# Altium footprint library std-th.PcbLib: 245 footprints (part 8 of 16)
Each footprint in its own frame and in the unit in brackets; x right, y up, seen from the top. Pads: shape width x height; smd on the part's side, far side on the other; paste and mask are expansions set on the pad; w line width, h text height; cw(c..) or ccw(c..) is an arc to the next point about the centre after c.
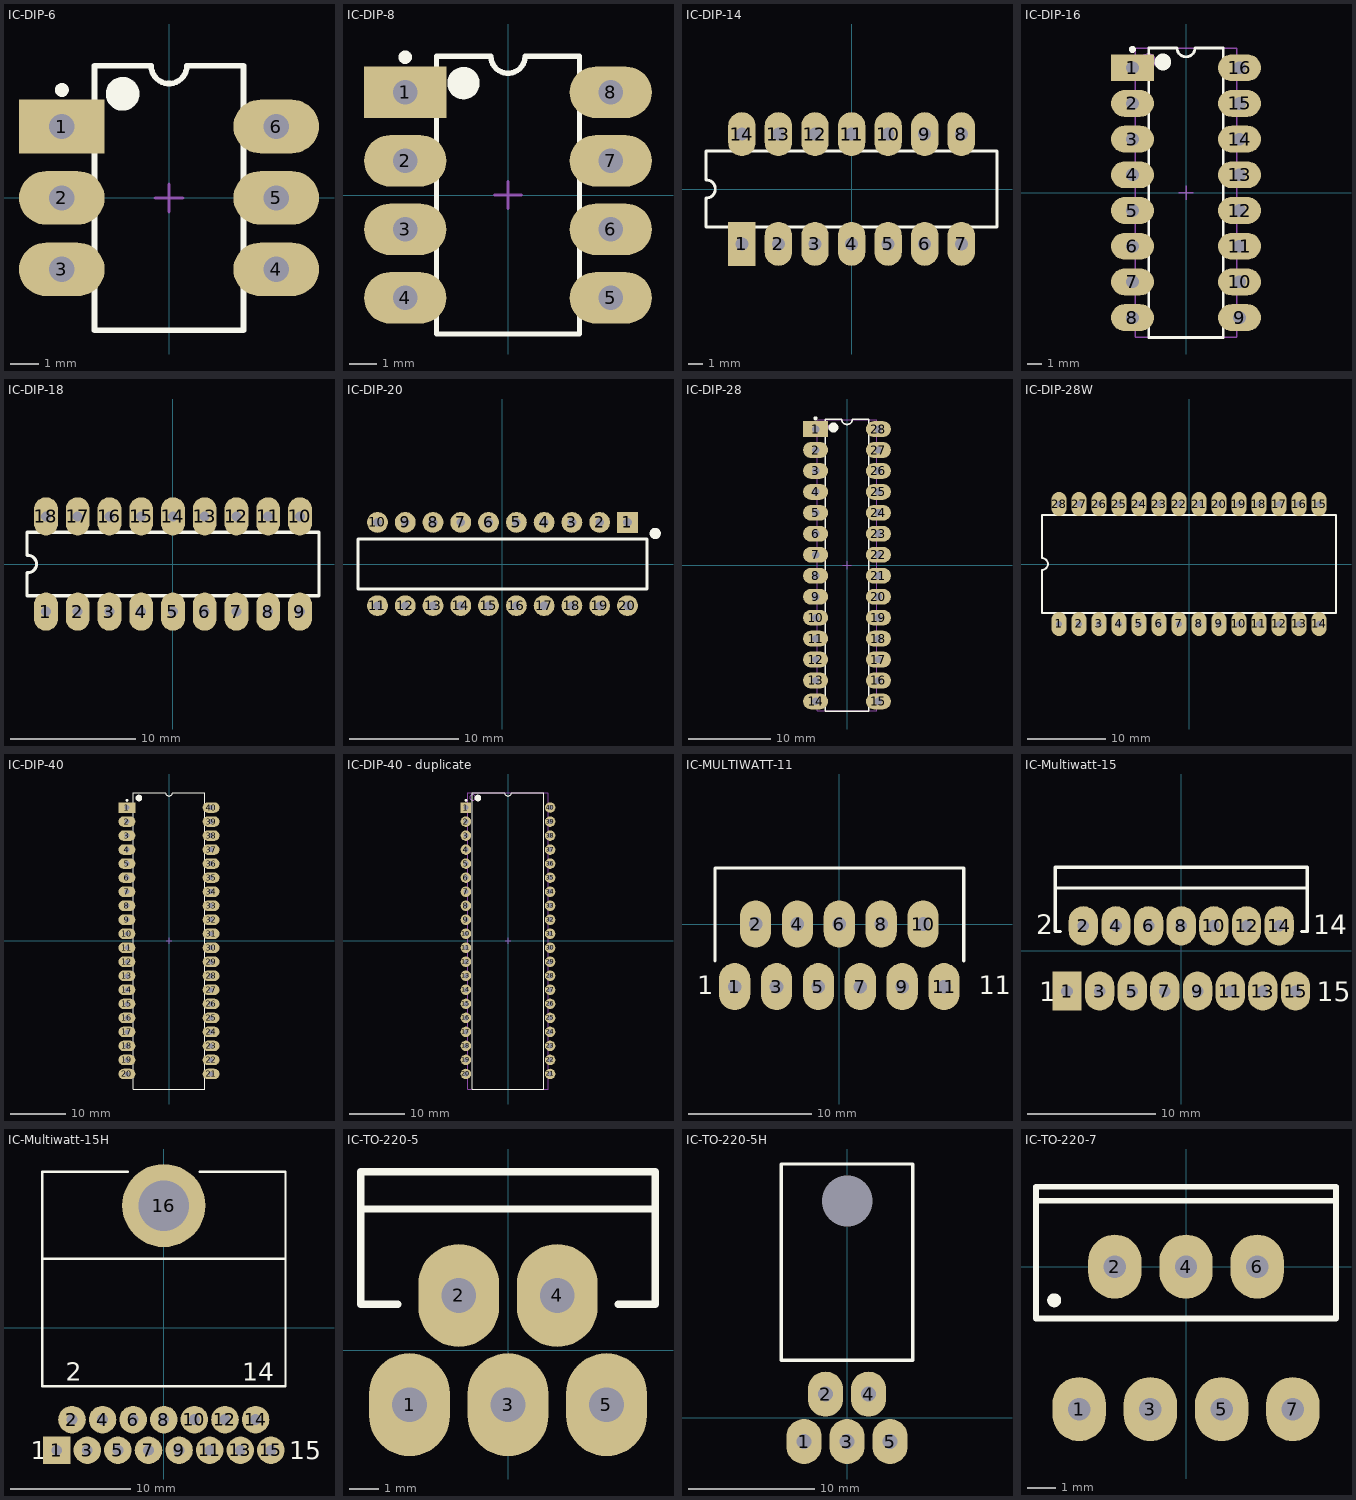
[diagram p7: the footprints below, top view; thin cyan lines are the x and y axes]

## IC-DIP-6 [mil] "DIP; 6 Leads; Row Spacing 7.62 mm; Pitch 2.54 mm"
height 214.96
pads (6):
  rect 120x75 hole 35.43: 1(-150,100)
  oval 120x75 hole 35.43: 2(-150,0) 3(-150,-100) 4(150,-100) 5(150,0) 6(150,100)
Top Overlay:
  circle w9.84: c-150,151.18 r4.92
  circle w23.62: c-64.96,145.67 r11.81
  lines w7.87: -104.33,-185.04 -104.33,185.04 -25,185.04 ccw(c0,185.04) 25,185.04 104.33,185.04 104.33,-185.04 -104.33,-185.04
Mechanical 15:
  lines w3.94: -19.68,0 19.68,0 ; 0,-19.68 0,19.68
3D body: height 224.8, standoff -125.2, extent -155.9,-175 155.91,175

## IC-DIP-8 [mil] "DIP, 8-Leads, Row Spacing 7.62mm, Pitch 2.54mm, Body 9.78x6.48mm"
height 175.2
pads (8):
  rect 120x75 hole 35.43: 1(-150,150)
  oval 120x75 hole 35.43: 2(-150,50) 3(-150,-50) 4(-150,-150) 5(150,-150) 6(150,-50) 7(150,50) 8(150,150)
Top Overlay:
  circle w23.62: c-64.96,163.39 r11.81
  circle w9.84: c-150,201.18 r4.92
  lines w7.87: -104.33,-202.76 104.33,-202.76 104.33,202.76 25,202.76 cw(c0,202.76) -25,202.76 -104.33,202.76 -104.33,-202.76
Mechanical 15:
  lines w3.94: -19.68,0 19.68,0 ; 0,-19.68 0,19.68
3D body: height 179.92, standoff -150, extent -153.93,-195.07 153.94,195.08

## IC-DIP-14 [mil] "DIP; 14 Leads; Row Spacing 7.62 mm; Pitch 2.54 mm"
height 200
pads (14):
  rect 75x120 hole 35.43: 1(-300,-150)
  oval 75x120 hole 35.43: 2(-200,-150) 3(-100,-150) 4(0,-150) 5(100,-150) 6(200,-150) 7(300,-150) 8(300,150) 9(200,150) 10(100,150) 11(0,150) 12(-100,150) 13(-200,150) 14(-300,150)
Top Overlay:
  lines w7.87: -397.64,-104.33 -397.64,-25 ccw(c-397.64,0) -397.64,25 -397.64,104.33 397.64,104.33 397.64,-104.33 -397.64,-104.33
3D body: height 177.17, standoff -137.8, extent -356.29,-152.76 356.3,152.77

## IC-DIP-16 [mil] "DIP; 16 Leads; Row Spacing 7.62 mm; Pitch 2.54 mm"
height 200
pads (16):
  rect 120x75 hole 35.43: 1(-150,350)
  oval 120x75 hole 35.43: 2(-150,250) 3(-150,150) 4(-150,50) 5(-150,-50) 6(-150,-150) 7(-150,-250) 8(-150,-350) 9(150,-350) 10(150,-250) 11(150,-150) 12(150,-50) 13(150,50) 14(150,150) 15(150,250) 16(150,350)
Top Overlay:
  circle w9.84: c-150,401.18 r4.92
  circle w23.62: c-64.96,366.14 r11.81
  lines w7.87: -104.33,-405.51 -104.33,405.51 -25,405.51 ccw(c0,405.51) 25,405.51 104.33,405.51 104.33,-405.51 -104.33,-405.51
Mechanical 13:
  circle w3.94: c-106.3,369.09 r19.68
  lines w3.94: -141.73,-404.53 -141.73,404.53 141.73,404.53 141.73,-404.53 -141.73,-404.53
Mechanical 15:
  lines w3.94: -19.68,0 19.68,0 ; 0,-19.68 0,19.68
3D body: height 202.76, standoff -98.03, extent -154.92,-433.08 154.92,433.06

## IC-DIP-18 [mil] "DIP-18 package, 100 mil pitch, 300 mil row pitch"
height 314.96
pads (18):
  oval 75x120 hole 31.5: 1(-400,-150) 2(-300,-150) 3(-200,-150) 4(-100,-150) 5(0,-150) 6(100,-150) 7(200,-150) 8(300,-150) 9(400,-150) 10(400,150) 11(300,150) 12(200,150) 13(100,150) 14(0,150) 15(-100,150) 16(-200,150) 17(-300,150) 18(-400,150)
Top Overlay:
  lines w10: -460.24,-99.76 -460.24,-27.38 ccw(c-457.49,-0.01) -460.24,27.37 -460.24,99.76 459.76,99.76 460,100 460,-99.76 350,-99.76 -460.24,-99.76
3D body: height 179.92, standoff -150, extent -457.49,-153.94 457.48,153.93

## IC-DIP-20 [mm] "IC, DIP 20"
height 3.5
pads (20):
  rect 1.905x1.905 hole 0.8: 1(11.43,3.81)
  round 1.905 hole 0.8: 2(8.89,3.81) 3(6.35,3.81) 4(3.81,3.81) 5(1.27,3.81) 6(-1.27,3.81) 7(-3.81,3.81) 8(-6.35,3.81) 9(-8.89,3.81) 10(-11.43,3.81) 11(-11.43,-3.81) 12(-8.89,-3.81) 13(-6.35,-3.81) 14(-3.81,-3.81) 15(-1.27,-3.81) 16(1.27,-3.81) 17(3.81,-3.81) 18(6.35,-3.81) 19(8.89,-3.81) 20(11.43,-3.81)
Top Overlay:
  circle w0.508: c13.97,2.794 r0.254
  lines w0.254: -13.208,-2.286 -13.208,2.286 13.208,2.286 13.208,-2.286 12.954,-2.286 -13.208,-2.286
3D body: height 4.57, standoff -3.81, extent -13.27,-3.916 13.27,3.904

## IC-DIP-28 [mil] "DIP, 28-Leads, Row Spacing 7.62mm, Pitch 2.54mm, Body 34.67x7.3mm"
height 180.31
pads (28):
  rect 120x75 hole 35.43: 1(-150,650)
  oval 120x75 hole 35.43: 2(-150,550) 3(-150,450) 4(-150,350) 5(-150,250) 6(-150,150) 7(-150,50) 8(-150,-50) 9(-150,-150) 10(-150,-250) 11(-150,-350) 12(-150,-450) 13(-150,-550) 14(-150,-650) 15(150,-650) 16(150,-550) 17(150,-450) 18(150,-350) 19(150,-250) 20(150,-150) 21(150,-50) 22(150,50) 23(150,150) 24(150,250) 25(150,350) 26(150,450) 27(150,550) 28(150,650)
Top Overlay:
  circle w23.62: c-64.96,657.48 r11.81
  circle w9.84: c-150,701.18 r4.92
  lines w7.87: -104.33,-696.85 104.33,-696.85 104.33,696.85 25,696.85 cw(c0,696.85) -25,696.85 -104.33,696.85 -104.33,-696.85
Mechanical 13:
  circle w3.94: c-106.3,659.45 r19.68
  lines w3.94: -141.73,-694.88 141.73,-694.88 141.73,694.88 -141.73,694.88 -141.73,-694.88
Mechanical 15:
  lines w3.94: -19.68,0 19.68,0 ; 0,-19.68 0,19.68
3D body: height 179.92, standoff -150, extent -153.94,-689.96 153.93,689.97

## IC-DIP-28W [mil] "DIP-28, wide"
height 314.96
pads (28):
  oval 75x120 hole 31.5: 1(-650,-300) 2(-550,-300) 3(-450,-300) 4(-350,-300) 5(-250,-300) 6(-150,-300) 7(-50,-300) 8(50,-300) 9(150,-300) 10(250,-300) 11(350,-300) 12(450,-300) 13(550,-300) 14(650,-300) 15(650,300) 16(550,300) 17(450,300) 18(350,300) 19(250,300) 20(150,300) 21(50,300) 22(-50,300) 23(-150,300) 24(-250,300) 25(-350,300) 26(-450,300) 27(-550,300) 28(-650,300)
Top Overlay:
  lines w10: -735.01,-244.99 -735.01,-29.96 ccw(c-735.05,-0.01) -734.99,29.95 -735,245 735,245 735,-245 -735,-245
3D body: height 200.39, standoff -150, extent -735.05,-303.94 735.03,303.93

## IC-DIP-40 [mil] "DIP, 40-Leads, Row Spacing 600 mil, 100 mil pitch"
height 250
pads (40):
  rect 120x75 hole 35.43: 1(-300,950)
  oval 120x75 hole 35.43: 2(-300,850) 3(-300,750) 4(-300,650) 5(-300,550) 6(-300,450) 7(-300,350) 8(-300,250) 9(-300,150) 10(-300,50) 11(-300,-50) 12(-300,-150) 13(-300,-250) 14(-300,-350) 15(-300,-450) 16(-300,-550) 17(-300,-650) 18(-300,-750) 19(-300,-850) 20(-300,-950) 21(300,-950) 22(300,-850) 23(300,-750) 24(300,-650) 25(300,-550) 26(300,-450) 27(300,-350) 28(300,-250) 29(300,-150) 30(300,-50) 31(300,50) 32(300,150) 33(300,250) 34(300,350) 35(300,450) 36(300,550) 37(300,650) 38(300,750) 39(300,850) 40(300,950)
Top Overlay:
  circle w23.62: c-214.57,1017.72 r11.81
  circle w9.84: c-300,1001.18 r4.92
  lines w7.87: -253.94,-1057.09 253.94,-1057.09 253.94,1057.09 25,1057.09 cw(c0,1057.09) -25,1057.09 -253.94,1057.09 -253.94,-1057.09
Mechanical 15:
  lines w3.94: -19.68,0 19.68,0 ; 0,-19.68 0,19.68
3D body: height 224.41, standoff -101.57, extent -304.92,-1032.48 304.92,1032.48

## IC-DIP-40 - duplicate [mm] "DIP, 40-Leads, Row Spacing 15.24mm, Pitch 2.54mm, Body 51.8x13.5mm"
height 6.35
pads (40):
  rect 1.905x1.905 hole 0.9: 1(-7.62,24.13)
  round 1.905 hole 0.9: 2(-7.62,21.59) 3(-7.62,19.05) 4(-7.62,16.51) 5(-7.62,13.97) 6(-7.62,11.43) 7(-7.62,8.89) 8(-7.62,6.35) 9(-7.62,3.81) 10(-7.62,1.27) 11(-7.62,-1.27) 12(-7.62,-3.81) 13(-7.62,-6.35) 14(-7.62,-8.89) 15(-7.62,-11.43) 16(-7.62,-13.97) 17(-7.62,-16.51) 18(-7.62,-19.05) 19(-7.62,-21.59) 20(-7.62,-24.13) 21(7.62,-24.13) 22(7.62,-21.59) 23(7.62,-19.05) 24(7.62,-16.51) 25(7.62,-13.97) 26(7.62,-11.43) 27(7.62,-8.89) 28(7.62,-6.35) 29(7.62,-3.81) 30(7.62,-1.27) 31(7.62,1.27) 32(7.62,3.81) 33(7.62,6.35) 34(7.62,8.89) 35(7.62,11.43) 36(7.62,13.97) 37(7.62,16.51) 38(7.62,19.05) 39(7.62,21.59) 40(7.62,24.13)
Top Overlay:
  circle w0.6: c-5.45,25.85 r0.3
  circle w0.25: c-7.62,25.43 r0.125
  lines w0.2: -6.45,-26.85 6.45,-26.85 6.45,26.85 0.635,26.85 cw(c0,26.85) -0.635,26.85 -6.45,26.85 -6.45,-26.85
Mechanical 13:
  circle w0.1: c-6.4,25.95 r0.5
  lines w0.1: -7.3,-26.85 7.3,-26.85 7.3,26.85 -7.3,26.85 -7.3,-26.85
Mechanical 15:
  lines w0.1: -0.5,0 0.5,0 ; 0,-0.5 0,0.5
3D body: height 4.06, standoff -3.3, extent -7.765,-26.13 7.765,26.13

## IC-MULTIWATT-11 [mm] "IC, Multiwatt 11"
height 20
pads (11):
  oval 2.54x3.81 hole 1.1: 1(-8.5,-5.08) 2(-6.8,0) 3(-5.1,-5.08) 4(-3.4,0) 5(-1.7,-5.08) 6(0,0) 7(1.7,-5.08) 8(3.4,0) 9(5.1,-5.08) 10(6.8,0) 11(8.5,-5.08)
Top Overlay:
  lines w0.254: -10.1,-2.988 -10.1,4.55 10.1,4.55 10.1,-2.988
  text "11" at 11.303,-5.715 h1.5
  text "1" at -11.557,-5.715 h1.5
3D body: height 21.8, standoff -3.2, extent -10.1,-5.34 10.1,4.55

## IC-Multiwatt-15 [mil] "TO, Thru-Hole, Horizontal, 15 Leads; Pitch 1.27 mm"
height 1181.1
pads (15):
  rect 90x120 hole 35.43: 1(-350,-124.14)
  oval 90x120 hole 35.43: 2(-300,75.86) 3(-250,-124.14) 4(-200,75.86) 5(-150,-124.14) 6(-100,75.86) 7(-50,-124.14) 8(0,75.86) 9(50,-124.14) 10(100,75.86) 11(150,-124.14) 12(200,75.86) 13(250,-124.14) 14(300,75.86) 15(350,-124.14)
Top Overlay:
  lines w10: -385.83,192 385.82,192 ; -370,58.14 -385.83,58.14 -385.83,255 385.82,255 385.83,255 385.83,58.15 385.82,58.14 368.14,58.14
  text "2" at -445,50 h59.06
  text "14" at 405,50 h59.06
  text "1" at -435,-155 h59.06
  text "15" at 415,-155 h59.06
3D body: height 833.12, standoff -44.83, extent -385.83,-134.37 385.83,255

## IC-Multiwatt-15H [mm] "TO, Thru-Hole, Horizontal, Heatsink Mounted; 15 Bent Staggered Leads; Pitch 1.27 mm"
height 5
pads (16):
  rect 2.286x2.286 hole 0.9: 1(-8.89,-10.155)
  round 2.286 hole 0.9: 2(-7.62,-7.615) 3(-6.35,-10.155) 4(-5.08,-7.615) 5(-3.81,-10.155) 6(-2.54,-7.615) 7(-1.27,-10.155) 8(0,-7.615) 9(1.27,-10.155) 10(2.54,-7.615) 11(3.81,-10.155) 12(5.08,-7.615) 13(6.35,-10.155) 14(7.62,-7.615) 15(8.89,-10.155)
  round 6.9 hole 4.2: 16(0,10.155)
Top Overlay:
  lines w0.2: -10.1,5.755 10.1,5.755 ; -3,12.955 -10.1,12.955 -10.1,-4.845 10.1,-4.845 10.1,12.955 3,12.955
  text "2" at -8.12,-4.37 h1.5
  text "14" at 6.495,-4.37 h1.5
  text "15" at 10.414,-10.922 h1.5
  text "1" at -11.049,-10.922 h1.5
3D body: height 5, standoff -1.5, extent -9.8,-10.415 9.8,13.185

## IC-TO-220-5 [mil] "TO-220, 5 leads"
height 590.55
pads (5):
  oval 110x140 hole 47.24: 1(-133.86,-74.21) 2(-66.93,74.21) 3(0,-74.21) 4(66.93,74.21) 5(133.86,-74.21)
Top Overlay:
  lines w10: -199.99,192.41 -199.4,191.82 200,191.82 ; -150,62.4 -200,62.4 -199.99,242.33 200.01,242.33 200.01,62.4 150,62.4
3D body: height 826.38, standoff -118.11, extent -199.99,-82.08 200.01,242.33

## IC-TO-220-5H [mil] "TO-220, 5 leads, horizontal"
pads (6):
  round 0 hole 157.48: 0(0,675.2)
  oval 110x140 hole 47.24: 1(-133.86,-73.82) 2(-66.93,73.82) 3(0,-73.82) 4(66.93,73.82) 5(133.86,-73.82)
Top Overlay:
  lines w10: -205,179.54 -204.71,179.82 -204.71,790.36 204.73,790.36 204.73,179.54 -205,179.54
3D body: height 188.98, standoff -240.16, extent -204.71,-84.64 204.73,790.36

## IC-TO-220-7 [mil] "TO, Thru-Hole, Vertical, Heatsink Mounted; 7 Dual Row In-Line Leads; Pitch 2.54 mm"
height 759.84
pads (7):
  oval 75x90 hole 31.5 unplated: 1(-150,-200.15) 2(-100,0) 3(-50,-200.15) 4(0,0) 5(50,-200.15) 6(100,0) 7(150,-200.15)
Top Overlay:
  circle w9.84: c-185.04,-47.24 r4.92
  lines w7.87: -210.63,92.52 210.63,92.52 ; -210.63,-72.83 210.63,-72.83 210.63,112.2 -210.63,112.2 -210.63,-72.83
Mechanical 13:
  lines w3.94: -210.63,-72.83 -210.63,112.2 210.63,112.2 210.63,-72.83 -210.63,-72.83
Mechanical 15:
  lines w3.94: -19.69,0 19.68,0 ; 0,-19.69 0,19.68
3D body: height 782.37, standoff -181.72, extent -200,-207.64 200,112.99